# Altium footprint library mcu_modules.PcbLib: 16 footprints (part 1 of 2)
Each footprint in its own frame and in the unit in brackets; x right, y up, seen from the top. Pads: shape width x height; smd on the part's side, far side on the other; paste and mask are expansions set on the pad; w line width, h text height; cw(c..) or ccw(c..) is an arc to the next point about the centre after c.
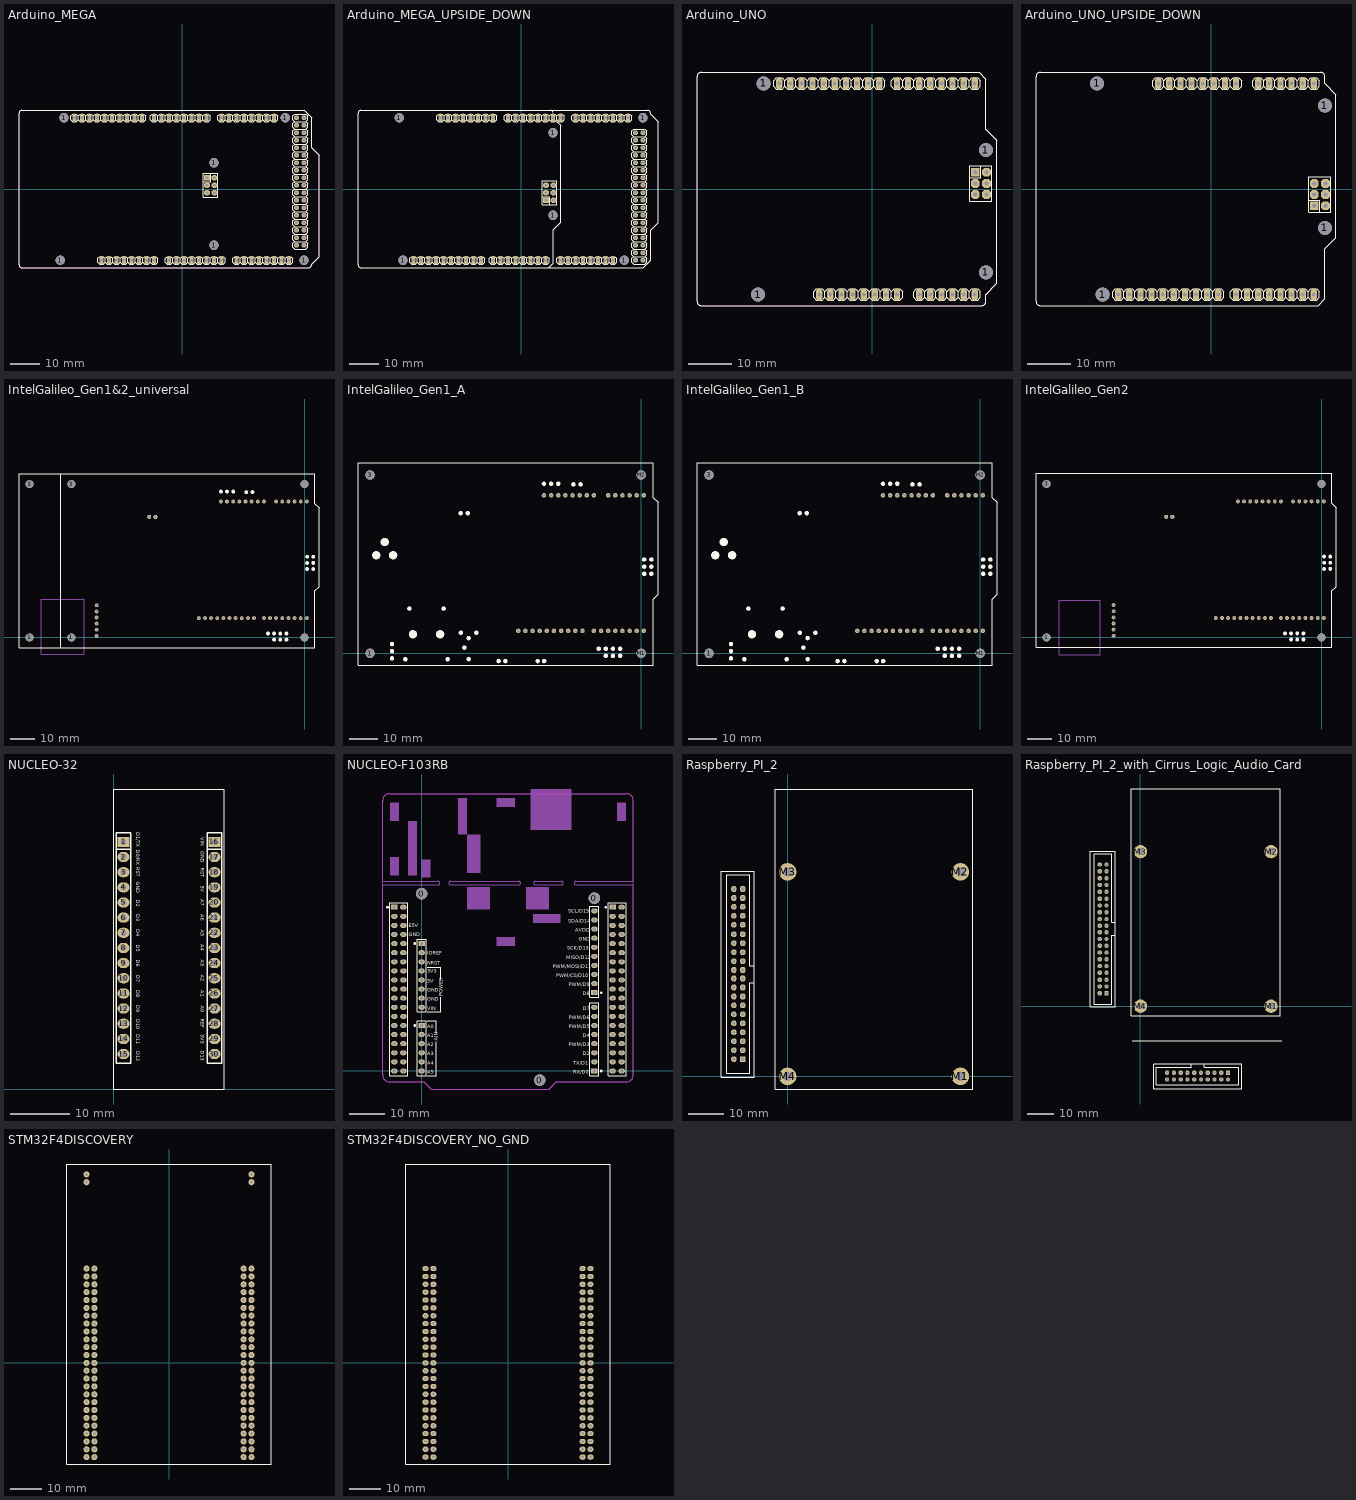
[diagram p0: the footprints below, top view; thin cyan lines are the x and y axes]

## Arduino_MEGA [mil]
pads (98):
  round 125.98 hole 125.98: 1(-1625,-950) 1(-1575,950) 1(425,-750) 1(425,350) 1(1375,950) 1(1625,-950)
  oct 66x66 hole 37.4: 5V(1525,950) 5V(1625,950) D22(1525,850) D23(1625,850) D24(1525,750) D25(1625,750) D26(1525,650) D27(1625,650) D28(1525,550) D29(1625,550) D30(1525,450) D31(1625,450) D32(1525,350) D33(1625,350) D34(1525,250) D35(1625,250) D36(1525,150) D37(1625,150) D38(1525,50) D39(1625,50) D40(1525,-50) D41(1625,-50) D42(1525,-150) D43(1625,-150) D44(1525,-250) D45(1625,-250) D46(1525,-350) D47(1625,-350) D48(1525,-450) D49(1625,-450) D50(1525,-550) D51(1625,-550) D52(1525,-650) D53(1625,-650) GND(1525,-750) GND(1625,-750)
  oval 56x112 hole 33.46: A0(-175,-950) A1(-75,-950) A2(25,-950) A3(125,-950) A4(225,-950) A5(325,-950) A6(425,-950) A7(525,-950) A8(725,-950) A9(825,-950) A10(925,-950) A11(1025,-950) A12(1125,-950) A13(1225,-950) A14(1325,-950) A15(1425,-950) AREF(-1235,950) D0(325,950) D1(225,950) D2(125,950) D3(25,950) D4(-75,950) D5(-175,950) D6(-275,950) D7(-375,950) D8(-535,950) D9(-635,950) D10(-735,950) D11(-835,950) D12(-935,950) D13(-1035,950) D14(525,950) D15(625,950) D16(725,950) D17(825,950) D18(925,950) D19(1025,950) D20(1125,950) D21(1225,950) GND(-1135,950) P1(-1075,-950) P2(-975,-950) P3(-875,-950) P4(-775,-950) P5(-675,-950) P6(-575,-950) P7(-475,-950) P8(-375,-950) SCL(-1435,950) SDA(-1335,950)
  rect 78.74x78.74 hole 39.37: PROG1(330,150)
  oct 78.74x78.74 hole 39.37: PROG2(430,150) PROG3(330,50) PROG4(430,50) PROG5(330,-50) PROG6(430,-50)
Top Overlay:
  drawing of 501 lines, arcs and shapes, not listed
Keep-Out Layer:
  lines w10: -2175,-1010.63 ccw(c-2135.63,-1010.63) -2135.63,-1050 1685.63,-1050 ccw(c1685.63,-1010.63) 1725,-1010.63 1725,-1000 1825,-900 1825,450 1725,550 1725,950 1625,1050 -2135.63,1050 ccw(c-2135.63,1010.63) -2175,1010.63 -2175,-1010.63
Mechanical 16:
  region: -365,960 -385,960 -385,940 -365,940
  region: 335,960 315,960 315,940 335,940
  region: 235,960 215,960 215,940 235,940
  region: 135,960 115,960 115,940 135,940
  region: 35,960 15,960 15,940 35,940
  region: -65,960 -85,960 -85,940 -65,940
  region: -165,960 -185,960 -185,940 -165,940
  region: -265,960 -285,960 -285,940 -265,940
  rectangle: 515,-960 535,-940
  rectangle: -185,-960 -165,-940
  rectangle: -85,-960 -65,-940
  rectangle: 15,-960 35,-940
  rectangle: 115,-960 135,-940
  rectangle: 215,-960 235,-940
  rectangle: 315,-960 335,-940
  rectangle: 415,-960 435,-940
  region: 535,960 515,960 515,940 535,940
  region: 1235,960 1215,960 1215,940 1235,940
  region: 1135,960 1115,960 1115,940 1135,940
  region: 1035,960 1015,960 1015,940 1035,940
  region: 935,960 915,960 915,940 935,940
  region: 835,960 815,960 815,940 835,940
  region: 735,960 715,960 715,940 735,940
  region: 635,960 615,960 615,940 635,940
  rectangle: 1415,-960 1435,-940
  rectangle: 715,-960 735,-940
  rectangle: 815,-960 835,-940
  rectangle: 915,-960 935,-940
  rectangle: 1015,-960 1035,-940
  rectangle: 1115,-960 1135,-940
  rectangle: 1215,-960 1235,-940
  rectangle: 1315,-960 1335,-940
  region: 1515,-740 1515,-760 1535,-760 1535,-740
  region: 1615,-740 1615,-760 1635,-760 1635,-740
  region: 1515,-640 1515,-660 1535,-660 1535,-640
  region: 1615,-640 1615,-660 1635,-660 1635,-640
  region: 1515,-540 1515,-560 1535,-560 1535,-540
  region: 1615,-540 1615,-560 1635,-560 1635,-540
  region: 1515,-440 1515,-460 1535,-460 1535,-440
  region: 1615,-440 1615,-460 1635,-460 1635,-440
  region: 1515,-340 1515,-360 1535,-360 1535,-340
  region: 1615,-340 1615,-360 1635,-360 1635,-340
  region: 1515,-240 1515,-260 1535,-260 1535,-240
  region: 1615,-240 1615,-260 1635,-260 1635,-240
  region: 1515,-140 1515,-160 1535,-160 1535,-140
  region: 1615,-140 1615,-160 1635,-160 1635,-140
  region: 1515,-40 1515,-60 1535,-60 1535,-40
  region: 1615,-40 1615,-60 1635,-60 1635,-40
  region: 1515,60 1515,40 1535,40 1535,60
  region: 1615,60 1615,40 1635,40 1635,60
  region: 1515,160 1515,140 1535,140 1535,160
  region: 1615,160 1615,140 1635,140 1635,160
  region: 1515,260 1515,240 1535,240 1535,260
  region: 1615,260 1615,240 1635,240 1635,260
  region: 1515,360 1515,340 1535,340 1535,360
  region: 1615,360 1615,340 1635,340 1635,360
  region: 1515,460 1515,440 1535,440 1535,460
  region: 1515,560 1515,540 1535,540 1535,560
  region: 1515,660 1515,640 1535,640 1535,660
  region: 1615,460 1615,440 1635,440 1635,460
  region: 1615,560 1615,540 1635,540 1635,560
  region: 1615,660 1615,640 1635,640 1635,660
  region: 1515,760 1515,740 1535,740 1535,760
  region: 1615,760 1615,740 1635,740 1635,760
  region: 1515,860 1515,840 1535,840 1535,860
  region: 1615,860 1615,840 1635,840 1635,860
  region: 1615,960 1615,940 1635,940 1635,960
  region: 1515,960 1515,940 1535,940 1535,960
  rectangle: -545,940 -525,960
  rectangle: -1445,940 -1425,960
  rectangle: -1345,940 -1325,960
  rectangle: -1245,940 -1225,960
  rectangle: -1145,940 -1125,960
  rectangle: -1045,940 -1025,960
  rectangle: -945,940 -925,960
  rectangle: -845,940 -825,960
  rectangle: -745,940 -725,960
  rectangle: -645,940 -625,960
  rectangle: -385,-960 -365,-940
  rectangle: -1085,-960 -1065,-940
  rectangle: -985,-960 -965,-940
  rectangle: -885,-960 -865,-940
  rectangle: -785,-960 -765,-940
  rectangle: -685,-960 -665,-940
  rectangle: -585,-960 -565,-940
  rectangle: -485,-960 -465,-940
3D body "Samtec-SSW-103-01-G-D.step": height 335, standoff -104, extent 282.49,-110 477.49,210
3D body "User Library-ARDUINO_MEGA_2560.STEP": height 694.88, standoff 94.49, extent -2424.99,-1049.99 1825.01,1050.01

## Arduino_MEGA_UPSIDE_DOWN [mil]
pads (98):
  round 125.98 hole 125.98: 1(-1625,950) 1(-1575,-950) 1(425,-350) 1(425,750) 1(1375,-950) 1(1625,950)
  oct 66x66 hole 37.4: 5V(1525,-950) 5V(1625,-950) D22(1525,-850) D23(1625,-850) D24(1525,-750) D25(1625,-750) D26(1525,-650) D27(1625,-650) D28(1525,-550) D29(1625,-550) D30(1525,-450) D31(1625,-450) D32(1525,-350) D33(1625,-350) D34(1525,-250) D35(1625,-250) D36(1525,-150) D37(1625,-150) D38(1525,-50) D39(1625,-50) D40(1525,50) D41(1625,50) D42(1525,150) D43(1625,150) D44(1525,250) D45(1625,250) D46(1525,350) D47(1625,350) D48(1525,450) D49(1625,450) D50(1525,550) D51(1625,550) D52(1525,650) D53(1625,650) GND(1525,750) GND(1625,750)
  oval 56x112 hole 33.46: A0(-175,950) A1(-75,950) A2(25,950) A3(125,950) A4(225,950) A5(325,950) A6(425,950) A7(525,950) A8(725,950) A9(825,950) A10(925,950) A11(1025,950) A12(1125,950) A13(1225,950) A14(1325,950) A15(1425,950) AREF(-1235,-950) D0(325,-950) D1(225,-950) D2(125,-950) D3(25,-950) D4(-75,-950) D5(-175,-950) D6(-275,-950) D7(-375,-950) D8(-535,-950) D9(-635,-950) D10(-735,-950) D11(-835,-950) D12(-935,-950) D13(-1035,-950) D14(525,-950) D15(625,-950) D16(725,-950) D17(825,-950) D18(925,-950) D19(1025,-950) D20(1125,-950) D21(1225,-950) GND(-1135,-950) P1(-1075,950) P2(-975,950) P3(-875,950) P4(-775,950) P5(-675,950) P6(-575,950) P7(-475,950) P8(-375,950) SCL(-1435,-950) SDA(-1335,-950)
  rect 78.74x78.74 hole 39.37: PROG1(330,-150)
  oct 78.74x78.74 hole 39.37: PROG2(430,-150) PROG3(330,-50) PROG4(430,-50) PROG5(330,50) PROG6(430,50)
Top Overlay:
  drawing of 507 lines, arcs and shapes, not listed
Mechanical 16:
  region: -365,-940 -385,-940 -385,-960 -365,-960
  region: 335,-940 315,-940 315,-960 335,-960
  region: 235,-940 215,-940 215,-960 235,-960
  region: 135,-940 115,-940 115,-960 135,-960
  region: 35,-940 15,-940 15,-960 35,-960
  region: -65,-940 -85,-940 -85,-960 -65,-960
  region: -165,-940 -185,-940 -185,-960 -165,-960
  region: -265,-940 -285,-940 -285,-960 -265,-960
  rectangle: 515,940 535,960
  rectangle: -185,940 -165,960
  rectangle: -85,940 -65,960
  rectangle: 15,940 35,960
  rectangle: 115,940 135,960
  rectangle: 215,940 235,960
  rectangle: 315,940 335,960
  rectangle: 415,940 435,960
  region: 535,-940 515,-940 515,-960 535,-960
  region: 1235,-940 1215,-940 1215,-960 1235,-960
  region: 1135,-940 1115,-940 1115,-960 1135,-960
  region: 1035,-940 1015,-940 1015,-960 1035,-960
  region: 935,-940 915,-940 915,-960 935,-960
  region: 835,-940 815,-940 815,-960 835,-960
  region: 735,-940 715,-940 715,-960 735,-960
  region: 635,-940 615,-940 615,-960 635,-960
  rectangle: 1415,940 1435,960
  rectangle: 715,940 735,960
  rectangle: 815,940 835,960
  rectangle: 915,940 935,960
  rectangle: 1015,940 1035,960
  rectangle: 1115,940 1135,960
  rectangle: 1215,940 1235,960
  rectangle: 1315,940 1335,960
  region: 1535,740 1535,760 1515,760 1515,740
  region: 1635,740 1635,760 1615,760 1615,740
  region: 1535,640 1535,660 1515,660 1515,640
  region: 1635,640 1635,660 1615,660 1615,640
  region: 1535,540 1535,560 1515,560 1515,540
  region: 1635,540 1635,560 1615,560 1615,540
  region: 1535,440 1535,460 1515,460 1515,440
  region: 1635,440 1635,460 1615,460 1615,440
  region: 1535,340 1535,360 1515,360 1515,340
  region: 1635,340 1635,360 1615,360 1615,340
  region: 1535,240 1535,260 1515,260 1515,240
  region: 1635,240 1635,260 1615,260 1615,240
  region: 1535,140 1535,160 1515,160 1515,140
  region: 1635,140 1635,160 1615,160 1615,140
  region: 1535,40 1535,60 1515,60 1515,40
  region: 1635,40 1635,60 1615,60 1615,40
  region: 1535,-60 1535,-40 1515,-40 1515,-60
  region: 1635,-60 1635,-40 1615,-40 1615,-60
  region: 1535,-160 1535,-140 1515,-140 1515,-160
  region: 1635,-160 1635,-140 1615,-140 1615,-160
  region: 1535,-260 1535,-240 1515,-240 1515,-260
  region: 1635,-260 1635,-240 1615,-240 1615,-260
  region: 1535,-360 1535,-340 1515,-340 1515,-360
  region: 1635,-360 1635,-340 1615,-340 1615,-360
  region: 1535,-460 1535,-440 1515,-440 1515,-460
  region: 1535,-560 1535,-540 1515,-540 1515,-560
  region: 1535,-660 1535,-640 1515,-640 1515,-660
  region: 1635,-460 1635,-440 1615,-440 1615,-460
  region: 1635,-560 1635,-540 1615,-540 1615,-560
  region: 1635,-660 1635,-640 1615,-640 1615,-660
  region: 1535,-760 1535,-740 1515,-740 1515,-760
  region: 1635,-760 1635,-740 1615,-740 1615,-760
  region: 1535,-860 1535,-840 1515,-840 1515,-860
  region: 1635,-860 1635,-840 1615,-840 1615,-860
  region: 1635,-960 1635,-940 1615,-940 1615,-960
  region: 1535,-960 1535,-940 1515,-940 1515,-960
  rectangle: -545,-960 -525,-940
  rectangle: -1445,-960 -1425,-940
  rectangle: -1345,-960 -1325,-940
  rectangle: -1245,-960 -1225,-940
  rectangle: -1145,-960 -1125,-940
  rectangle: -1045,-960 -1025,-940
  rectangle: -945,-960 -925,-940
  rectangle: -845,-960 -825,-940
  rectangle: -745,-960 -725,-940
  rectangle: -645,-960 -625,-940
  rectangle: -385,940 -365,960
  rectangle: -1085,940 -1065,960
  rectangle: -985,940 -965,960
  rectangle: -885,940 -865,960
  rectangle: -785,940 -765,960
  rectangle: -685,940 -665,960
  rectangle: -585,940 -565,960
  rectangle: -485,940 -465,960
3D body "User Library-ARDUINO_MEGA_2560.STEP": height 692.91, standoff 92.52, extent -2424.99,-1050 1825.01,1050
3D body "Samtec-SSW-103-01-G-D.step": height 335, standoff -104, extent 282.5,-209.99 477.5,110.01

## Arduino_UNO [mil]
pads (42):
  round 125.98 hole 125.98: 1(-1025,-950) 1(-975,950) 1(1025,-750) 1(1025,350)
  oval 56x112 hole 33.46: A0(425,-950) A1(525,-950) A2(625,-950) A3(725,-950) A4(825,-950) A5(925,-950) AREF(-635,950) D0(925,950) D1(825,950) D2(725,950) D3(625,950) D4(525,950) D5(425,950) D6(325,950) D7(225,950) D8(65,950) D9(-35,950) D10(-135,950) D11(-235,950) D12(-335,950) D13(-435,950) GND(-535,950) P1(-475,-950) P2(-375,-950) P3(-275,-950) P4(-175,-950) P5(-75,-950) P6(25,-950) P7(125,-950) P8(225,-950) SCL(-835,950) SDA(-735,950)
  rect 78.74x78.74 hole 39.37: PROG1(930,150)
  oct 78.74x78.74 hole 39.37: PROG2(1030,150) PROG3(930,50) PROG4(1030,50) PROG5(930,-50) PROG6(1030,-50)
Top Overlay:
  drawing of 246 lines, arcs and shapes, not listed
Keep-Out Layer:
  lines w10: -1575,-1010.63 ccw(c-1535.63,-1010.63) -1535.63,-1050 985.63,-1050 ccw(c985.63,-1010.63) 1025,-1010.63 1025,-950 1125,-850 1125,440 1025,540 1025,990 965,1050 -1535.63,1050 ccw(c-1535.63,1010.63) -1575,1010.63 -1575,-1010.63
Mechanical 16:
  rectangle: 115,-960 135,-940
  rectangle: 15,-960 35,-940
  rectangle: -85,-960 -65,-940
  rectangle: -185,-960 -165,-940
  rectangle: -285,-960 -265,-940
  rectangle: -385,-960 -365,-940
  rectangle: -485,-960 -465,-940
  rectangle: 215,-960 235,-940
  rectangle: 815,-960 835,-940
  rectangle: 715,-960 735,-940
  rectangle: 615,-960 635,-940
  rectangle: 515,-960 535,-940
  rectangle: 415,-960 435,-940
  rectangle: 915,-960 935,-940
  region: -725,960 -745,960 -745,940 -725,940
  region: -625,960 -645,960 -645,940 -625,940
  region: -525,960 -545,960 -545,940 -525,940
  region: -425,960 -445,960 -445,940 -425,940
  region: -325,960 -345,960 -345,940 -325,940
  region: -225,960 -245,960 -245,940 -225,940
  region: -125,960 -145,960 -145,940 -125,940
  region: -25,960 -45,960 -45,940 -25,940
  region: 75,960 55,960 55,940 75,940
  region: -825,960 -845,960 -845,940 -825,940
  region: 335,960 315,960 315,940 335,940
  region: 435,960 415,960 415,940 435,940
  region: 535,960 515,960 515,940 535,940
  region: 635,960 615,960 615,940 635,940
  region: 735,960 715,960 715,940 735,940
  region: 835,960 815,960 815,940 835,940
  region: 935,960 915,960 915,940 935,940
  region: 235,960 215,960 215,940 235,940
Mechanical 69:
  text "D:/SmartProjects/Snc/a4_bn_logo2.bmp" at -1575,-1052.5 h0.85
3D body "Samtec-SSW-103-01-G-D.step": height 335, standoff -104, extent 882.49,-110 1077.49,210
3D body "User Library-ARDUINO_UNO_R3_1.STEP": height 696.85, standoff 96.46, extent -1824.99,-1049.99 1125.01,1050.01

## Arduino_UNO_UPSIDE_DOWN [mil]
pads (42):
  round 125.98 hole 125.98: 1(-1025,950) 1(-975,-950) 1(1025,-350) 1(1025,750)
  oval 56x112 hole 33.46: A0(425,950) A1(525,950) A2(625,950) A3(725,950) A4(825,950) A5(925,950) AREF(-635,-950) D0(925,-950) D1(825,-950) D2(725,-950) D3(625,-950) D4(525,-950) D5(425,-950) D6(325,-950) D7(225,-950) D8(65,-950) D9(-35,-950) D10(-135,-950) D11(-235,-950) D12(-335,-950) D13(-435,-950) GND(-535,-950) P1(-475,950) P2(-375,950) P3(-275,950) P4(-175,950) P5(-75,950) P6(25,950) P7(125,950) P8(225,950) SCL(-835,-950) SDA(-735,-950)
  rect 78.74x78.74 hole 39.37: PROG1(930,-150)
  oct 78.74x78.74 hole 39.37: PROG2(1030,-150) PROG3(930,-50) PROG4(1030,-50) PROG5(930,50) PROG6(1030,50)
Top Overlay:
  drawing of 246 lines, arcs and shapes, not listed
Mechanical 16:
  region: 235,-940 215,-940 215,-960 235,-960
  region: 935,-940 915,-940 915,-960 935,-960
  region: 835,-940 815,-940 815,-960 835,-960
  region: 735,-940 715,-940 715,-960 735,-960
  region: 635,-940 615,-940 615,-960 635,-960
  region: 535,-940 515,-940 515,-960 535,-960
  region: 435,-940 415,-940 415,-960 435,-960
  region: 335,-940 315,-940 315,-960 335,-960
  region: -825,-940 -845,-940 -845,-960 -825,-960
  region: 75,-940 55,-940 55,-960 75,-960
  region: -25,-940 -45,-940 -45,-960 -25,-960
  region: -125,-940 -145,-940 -145,-960 -125,-960
  region: -225,-940 -245,-940 -245,-960 -225,-960
  region: -325,-940 -345,-940 -345,-960 -325,-960
  region: -425,-940 -445,-940 -445,-960 -425,-960
  region: -525,-940 -545,-940 -545,-960 -525,-960
  region: -625,-940 -645,-940 -645,-960 -625,-960
  region: -725,-940 -745,-940 -745,-960 -725,-960
  rectangle: 915,940 935,960
  rectangle: 415,940 435,960
  rectangle: 515,940 535,960
  rectangle: 615,940 635,960
  rectangle: 715,940 735,960
  rectangle: 815,940 835,960
  rectangle: 215,940 235,960
  rectangle: -485,940 -465,960
  rectangle: -385,940 -365,960
  rectangle: -285,940 -265,960
  rectangle: -185,940 -165,960
  rectangle: -85,940 -65,960
  rectangle: 15,940 35,960
  rectangle: 115,940 135,960
Mechanical 69:
  text "D:/SmartProjects/Snc/a4_bn_logo2.bmp" at -1575,1052.5 h0.85
3D body "Samtec-SSW-103-01-G-D.step": height 335, standoff -104, extent 882.5,-209.99 1077.5,110.01
3D body "User Library-ARDUINO_UNO_R3_1.STEP": height 690.95, standoff 90.55, extent -1825,-1050 1125,1050

## IntelGalileo_Gen1&2_universal [mm]
pads (68):
  round 3.3 hole 3.3: 1(-113.792,0) 1(-96.5,0) 3(-113.792,63.5) 3(-96.5,63.5) M1(0,0) M2(0,63.5)
  round 1.6 on Top Overlay: 37(-64.262,49.886) 37(-61.722,49.886) 37(-34.595,60.376) 37(-32.055,60.376) 37(-29.515,60.376) 37(-24.105,60.147) 37(-21.565,60.147) 37(-15.113,1.626) 37(-12.573,-0.914) 37(-12.573,1.626) 37(-10.033,-0.914) 37(-10.033,1.626) 37(-10.033,1.626) 37(-10.033,1.626) 37(-7.493,-0.914) 37(-7.493,1.626) 37(1.092,28.321) 37(1.092,30.861) 37(1.092,33.401) 37(3.632,28.321) 37(3.632,30.861) 37(3.632,33.401)
  round 1.6 hole 1: A0(-11.735,56.261) A1(-9.195,56.261) A2(-6.655,56.261) A3(-4.115,56.261) A4(-1.575,56.261) A5(0.965,56.261) COIN+(-61.722,49.886) COIN-(-64.262,49.886) D0(0.965,8.001) D1(-1.575,8.001) D2(-4.115,8.001) D3(-6.655,8.001) D4(-9.195,8.001) D5(-11.735,8.001) D6(-14.275,8.001) D7(-16.815,8.001) D8(-20.879,8.001) D9(-23.419,8.001) D10(-25.959,8.001) D11(-28.499,8.001) D12(-31.039,8.001) D13(-33.579,8.001) D14(-36.119,8.001) D15(-38.659,8.001) D16(-41.199,8.001) D17(-43.739,8.001) P1(-34.595,56.261) P2(-32.055,56.261) P3(-29.515,56.261) P4(-26.975,56.261) P5(-24.435,56.261) P6(-21.895,56.261) P7(-19.355,56.261) P8(-16.815,56.261) U1(-86.03,13.335) U2(-86.03,10.795) U3(-86.03,8.255) U4(-86.03,5.715) U5(-86.03,3.175) U6(-86.03,0.635)
Top Overlay:
  lines w0.2: -100.8,-4.2 -100.8,67.8 ; -118.161,-4.2 -118.161,67.8 4.3,67.8 4.3,55.4 6,53.7 6,21 4.3,19.3 4.3,-4.2 -118.161,-4.2
Mechanical 3:
  lines w0.2: -108.89,-6.985 -91.11,-6.985 -91.11,15.875 -108.89,15.875 -108.89,-6.985
3D body "Samtec-SSW-106-01-G-S.step": height 8.51, standoff -2.64, extent -87.236,-0.889 -84.823,14.859
3D body "User Library-RMS-001L-08A0-GY.STEP": height 14.85, standoff -1.95, extent -107.9,-6.6 -91.9,14.7
3D body: height 18, standoff 12.6, extent -84.4,59.3 -71.5,64.5
3D body "Samtec-TSW-106-23-F-S.STEP": height 14.02, standoff 2.72, extent -87.37,-0.54 -84.83,14.7
3D body "User Library-MicroUSB-B_Molex_105017-0001.step": height 11.83, standoff 8.52, extent -79.6,-5.5 -71.4,-0.07
3D body "screwcl_m3x16.stp": height 14.56, standoff -3.44, extent -2.75,-2.75 2.75,2.75
3D body "screwcl_m3x16.stp": height 14.56, standoff -3.44, extent -2.75,60.75 2.75,66.25
3D body "screwcl_m3x16.stp": height 14.56, standoff -3.44, extent -116.542,-2.75 -111.042,2.75
3D body "screwcl_m3x16.stp": height 14.56, standoff -3.44, extent -116.542,60.75 -111.042,66.25
3D body "User Library-PCI Express Mini Card (Full-Mini Card).step": height 20.7, standoff 15.95, extent -68,9.525 -38,60.475
3D body "483380065.STEP": height 19, standoff 11.85, extent -67.85,56.2 -37.85,65.5
3D body "Samtec-TSW-110-23-F-S.STEP": height 8.38, standoff -2.92, extent -45.009,6.731 -19.609,9.271
3D body "Samtec-TSW-108-23-F-S.STEP": height 8.38, standoff -2.92, extent -18.085,6.731 2.235,9.271
3D body "Samtec-TSW-106-23-F-S.STEP": height 8.38, standoff -2.92, extent -13.005,54.991 2.235,57.531
3D body "Samtec-TSW-108-23-F-S.STEP": height 8.38, standoff -2.92, extent -35.865,54.991 -15.545,57.531
3D body "Samtec-TSW-103-23-F-S.STEP": height 14.02, standoff 2.72, extent -90.08,16.63 -82.46,19.17
3D body "Samtec-TSW-103-23-F-S.STEP": height 14.02, standoff 2.72, extent -35.865,59.106 -28.245,61.646
3D body "Samtec-TSW-102-23-F-S.STEP": height 14.02, standoff 2.72, extent -65.532,48.616 -60.452,51.156
3D body "Samtec-TSW-102-23-F-S.STEP": height 14.02, standoff 2.72, extent -25.375,58.877 -20.295,61.417
3D body "Samtec-TSW-103-23-F-D.STEP": height 14.02, standoff 2.72, extent -0.178,27.051 4.902,34.671
3D body "Samtec-TSW-104-23-F-D.STEP": height 14.02, standoff 2.72, extent -16.383,-2.184 -6.223,2.896
3D body "Samtec-SSW-106-01-G-S.step": height 13.74, standoff 2.59, extent -13.259,55.055 2.489,57.468
3D body "Samtec-SSW-108-01-G-S.step": height 13.74, standoff 2.59, extent -36.119,55.055 -15.291,57.468
3D body "Samtec-SSW-108-01-G-S.step": height 13.74, standoff 2.59, extent -18.339,6.795 2.489,9.208
3D body "Samtec-SSW-110-01-G-S.step": height 13.74, standoff 2.59, extent -45.263,6.795 -19.355,9.208
3D body: height 12.7, standoff 11.1, extent -118.161,-4.2 6,67.8
3D body "User Library-dc range - dc connector[4840_2201].step": height 14.7, standoff 0.2, extent -119.913,20.4 -106.087,29.905
3D body "User Library-USB Socket.step": height 12.73, standoff 4.7, extent -63,-6.14 -48.4,8.09
3D body "Samtec-SSW-101-01-G-D.step": height 8.51, standoff -2.64, extent -65.469,48.362 -60.515,51.41

## IntelGalileo_Gen1_A [mm]
pads (79):
  round 3.3 hole 3.3: 1(-96.5,0) 3(-96.5,63.5) M1(0,0) M2(0,63.5)
  round 3 on Top Overlay: 37(-94.29,34.925) 37(-91.29,39.625) 37(-88.29,34.925) 37(-81.229,6.807) 37(-71.577,6.807)
  round 1.6 on Top Overlay: 37(-88.697,-1.778) 37(-88.697,0.762) 37(-88.697,3.302) 37(-83.922,-2.083) 37(-82.499,15.951) 37(-70.307,15.951) 37(-68.885,-2.083) 37(-64.262,49.886) 37(-64.166,7.332) 37(-62.916,2.032) 37(-61.722,49.886) 37(-61.416,-2.068) 37(-61.416,5.432) 37(-58.666,7.332) 37(-50.731,-2.743) 37(-48.329,-2.743) 37(-36.812,-2.743) 37(-34.595,60.376) 37(-34.512,-2.743) 37(-32.055,60.376) 37(-29.515,60.376) 37(-24.105,60.147) 37(-21.565,60.147) 37(-15.113,1.626) 37(-12.573,-0.914) 37(-12.573,1.626) 37(-10.033,-0.914) 37(-10.033,1.626) 37(-10.033,1.626) 37(-10.033,1.626) 37(-7.493,-0.914) 37(-7.493,1.626) 37(1.092,28.321) 37(1.092,30.861) 37(1.092,33.401) 37(3.632,28.321) 37(3.632,30.861) 37(3.632,33.401)
  round 1.6 hole 1: A0(-11.735,56.261) A1(-9.195,56.261) A2(-6.655,56.261) A3(-4.115,56.261) A4(-1.575,56.261) A5(0.965,56.261) D0(0.965,8.001) D1(-1.575,8.001) D2(-4.115,8.001) D3(-6.655,8.001) D4(-9.195,8.001) D5(-11.735,8.001) D6(-14.275,8.001) D7(-16.815,8.001) D8(-20.879,8.001) D9(-23.419,8.001) D10(-25.959,8.001) D11(-28.499,8.001) D12(-31.039,8.001) D13(-33.579,8.001) D14(-36.119,8.001) D15(-38.659,8.001) D16(-41.199,8.001) D17(-43.739,8.001) P1(-34.595,56.261) P2(-32.055,56.261) P3(-29.515,56.261) P4(-26.975,56.261) P5(-24.435,56.261) P6(-21.895,56.261) P7(-19.355,56.261) P8(-16.815,56.261)
Top Overlay:
  lines w0.2: -100.8,-4.2 4.3,-4.2 4.3,19.3 6,21 6,53.7 4.3,55.4 4.3,67.8 -100.8,67.8 -100.8,-4.2
3D body "screwcl_m3x16.stp": height 14.56, standoff -3.44, extent -2.75,-2.75 2.75,2.75
3D body "screwcl_m3x16.stp": height 14.56, standoff -3.44, extent -2.75,60.75 2.75,66.25
3D body "screwcl_m3x16.stp": height 14.56, standoff -3.44, extent -99.25,60.75 -93.75,66.25
3D body: height 12.7, standoff 11.1, extent -100.8,-4.2 6,67.8
3D body "Samtec-SSW-110-01-G-S.step": height 13.74, standoff 2.59, extent -45.263,6.795 -19.355,9.208
3D body "Samtec-SSW-108-01-G-S.step": height 13.74, standoff 2.59, extent -18.339,6.795 2.489,9.208
3D body "Samtec-SSW-108-01-G-S.step": height 13.74, standoff 2.59, extent -36.119,55.055 -15.291,57.468
3D body "Samtec-SSW-106-01-G-S.step": height 13.74, standoff 2.59, extent -13.259,55.055 2.489,57.468
3D body "Samtec-TSW-104-23-F-D.STEP": height 14.02, standoff 2.72, extent -16.383,-2.184 -6.223,2.896
3D body "Samtec-TSW-103-23-F-D.STEP": height 14.02, standoff 2.72, extent -0.178,27.051 4.902,34.671
3D body "Samtec-TSW-102-23-F-S.STEP": height 14.02, standoff 2.72, extent -25.375,58.877 -20.295,61.417
3D body "Samtec-TSW-102-23-F-S.STEP": height 14.02, standoff 2.72, extent -65.532,48.616 -60.452,51.156
3D body "Samtec-TSW-103-23-F-S.STEP": height 14.02, standoff 2.72, extent -35.865,59.106 -28.245,61.646
3D body: height 11.1, standoff 0, extent -85.5,-5.5 -67.5,18.5
3D body: height 11.1, standoff 0, extent -101.5,30 -86.5,40
3D body: height 11.1, standoff 5.1, extent -65,-5.5 -58,8.5
3D body "Samtec-TSW-103-23-F-S.STEP": height 14.02, standoff 2.72, extent -89.967,-3.048 -87.427,4.572
3D body "Samtec-TSW-108-23-F-S.STEP": height 8.38, standoff -2.92, extent -35.865,54.991 -15.545,57.531
3D body "Samtec-TSW-106-23-F-S.STEP": height 8.38, standoff -2.92, extent -13.005,54.991 2.235,57.531
3D body "Samtec-TSW-108-23-F-S.STEP": height 8.38, standoff -2.92, extent -18.085,6.731 2.235,9.271
3D body "Samtec-TSW-110-23-F-S.STEP": height 8.38, standoff -2.92, extent -45.009,6.731 -19.609,9.271
3D body "483380065.STEP": height 19, standoff 11.85, extent -67.85,56.2 -37.85,65.5
3D body "User Library-PCI Express Mini Card (Full-Mini Card).step": height 20.7, standoff 15.95, extent -68,9.525 -38,60.475
3D body "screwcl_m3x16.stp": height 14.56, standoff -3.44, extent -99.25,-2.75 -93.75,2.75

## IntelGalileo_Gen1_B [mm]
pads (79):
  round 3.3 hole 3.3: 1(-96.5,0) 3(-96.5,63.5) M1(0,0) M2(0,63.5)
  round 3 on Top Overlay: 37(-94.29,34.925) 37(-91.29,39.625) 37(-88.29,34.925) 37(-81.229,6.807) 37(-71.577,6.807)
  round 1.6 on Top Overlay: 37(-88.697,-1.778) 37(-88.697,0.762) 37(-88.697,3.302) 37(-83.922,-2.083) 37(-82.499,15.951) 37(-70.307,15.951) 37(-68.885,-2.083) 37(-64.262,49.886) 37(-64.166,7.332) 37(-62.916,2.032) 37(-61.722,49.886) 37(-61.416,-2.068) 37(-61.416,5.432) 37(-58.666,7.332) 37(-50.731,-2.743) 37(-48.329,-2.743) 37(-36.812,-2.743) 37(-34.595,60.376) 37(-34.512,-2.743) 37(-32.055,60.376) 37(-29.515,60.376) 37(-24.105,60.147) 37(-21.565,60.147) 37(-15.113,1.626) 37(-12.573,-0.914) 37(-12.573,1.626) 37(-10.033,-0.914) 37(-10.033,1.626) 37(-10.033,1.626) 37(-10.033,1.626) 37(-7.493,-0.914) 37(-7.493,1.626) 37(1.092,28.321) 37(1.092,30.861) 37(1.092,33.401) 37(3.632,28.321) 37(3.632,30.861) 37(3.632,33.401)
  round 1.6 hole 1: A0(-11.735,56.261) A1(-9.195,56.261) A2(-6.655,56.261) A3(-4.115,56.261) A4(-1.575,56.261) A5(0.965,56.261) D0(0.965,8.001) D1(-1.575,8.001) D2(-4.115,8.001) D3(-6.655,8.001) D4(-9.195,8.001) D5(-11.735,8.001) D6(-14.275,8.001) D7(-16.815,8.001) D8(-20.879,8.001) D9(-23.419,8.001) D10(-25.959,8.001) D11(-28.499,8.001) D12(-31.039,8.001) D13(-33.579,8.001) D14(-36.119,8.001) D15(-38.659,8.001) D16(-41.199,8.001) D17(-43.739,8.001) P1(-34.595,56.261) P2(-32.055,56.261) P3(-29.515,56.261) P4(-26.975,56.261) P5(-24.435,56.261) P6(-21.895,56.261) P7(-19.355,56.261) P8(-16.815,56.261)
Top Overlay:
  lines w0.2: -100.8,-4.2 -100.8,67.8 4.3,67.8 4.3,55.4 6,53.7 6,21 4.3,19.3 4.3,-4.2 -100.8,-4.2
3D body "User Library-PCI Express Mini Card (Full-Mini Card).step": height 23.3, standoff 18.55, extent -69.4,9.825 -39.4,60.775
3D body "483380065.STEP": height 19, standoff 11.85, extent -67.85,56.2 -37.85,65.5
3D body "Samtec-TSW-110-23-F-S.STEP": height 8.38, standoff -2.92, extent -45.009,6.731 -19.609,9.271
3D body "Samtec-TSW-108-23-F-S.STEP": height 8.38, standoff -2.92, extent -18.085,6.731 2.235,9.271
3D body "Samtec-TSW-106-23-F-S.STEP": height 8.38, standoff -2.92, extent -13.005,54.991 2.235,57.531
3D body "Samtec-TSW-108-23-F-S.STEP": height 8.38, standoff -2.92, extent -35.865,54.991 -15.545,57.531
3D body "Samtec-TSW-103-23-F-S.STEP": height 14.02, standoff 2.72, extent -89.967,-3.048 -87.427,4.572
3D body "Samtec-TSW-103-23-F-S.STEP": height 14.02, standoff 2.72, extent -35.865,59.106 -28.245,61.646
3D body "Samtec-TSW-102-23-F-S.STEP": height 14.02, standoff 2.72, extent -65.532,48.616 -60.452,51.156
3D body "Samtec-TSW-102-23-F-S.STEP": height 14.02, standoff 2.72, extent -25.375,58.877 -20.295,61.417
3D body "board.STEP": height 23.9, standoff -1.2, extent -102,-5.762 5.478,68

## IntelGalileo_Gen2 [mm]
pads (61):
  round 3.3 hole 3.3: 1(-113.792,0) 3(-113.792,63.5) M1(0,0) M2(0,63.5)
  round 1.6 on Top Overlay: 37(-64.262,49.886) 37(-61.722,49.886) 37(-15.113,1.626) 37(-12.573,-0.914) 37(-12.573,1.626) 37(-10.033,-0.914) 37(-10.033,1.626) 37(-10.033,1.626) 37(-10.033,1.626) 37(-7.493,-0.914) 37(-7.493,1.626) 37(1.092,28.321) 37(1.092,30.861) 37(1.092,33.401) 37(3.632,28.321) 37(3.632,30.861) 37(3.632,33.401)
  round 1.6 hole 1: A0(-11.735,56.261) A1(-9.195,56.261) A2(-6.655,56.261) A3(-4.115,56.261) A4(-1.575,56.261) A5(0.965,56.261) COIN+(-61.722,49.886) COIN-(-64.262,49.886) D0(0.965,8.001) D1(-1.575,8.001) D2(-4.115,8.001) D3(-6.655,8.001) D4(-9.195,8.001) D5(-11.735,8.001) D6(-14.275,8.001) D7(-16.815,8.001) D8(-20.879,8.001) D9(-23.419,8.001) D10(-25.959,8.001) D11(-28.499,8.001) D12(-31.039,8.001) D13(-33.579,8.001) D14(-36.119,8.001) D15(-38.659,8.001) D16(-41.199,8.001) D17(-43.739,8.001) P1(-34.595,56.261) P2(-32.055,56.261) P3(-29.515,56.261) P4(-26.975,56.261) P5(-24.435,56.261) P6(-21.895,56.261) P7(-19.355,56.261) P8(-16.815,56.261) U1(-86.03,13.335) U2(-86.03,10.795) U3(-86.03,8.255) U4(-86.03,5.715) U5(-86.03,3.175) U6(-86.03,0.635)
Top Overlay:
  lines w0.2: -118.161,-4.2 4.3,-4.2 4.3,19.3 6,21 6,53.7 4.3,55.4 4.3,67.8 -118.161,67.8 -118.161,-4.2
Mechanical 3:
  lines w0.2: -108.585,-7.112 -108.585,15.24 -91.567,15.24 -91.567,-7.112 -108.585,-7.112
3D body "Samtec-TSW-106-23-F-S.STEP": height 14.02, standoff 2.72, extent -87.3,-0.635 -84.76,14.605
3D body "Samtec-SSW-106-01-G-S.step": height 8.51, standoff -2.64, extent -87.236,-0.889 -84.823,14.859
3D body: height -12.6, standoff -13, extent -118.161,-4.2 6,67.8
3D body "Samtec-SSW-101-01-G-D.step": height 8.51, standoff -2.64, extent -65.469,48.362 -60.515,51.41
3D body "User Library-USB Socket.step": height 12.73, standoff 4.7, extent -63,-6.14 -48.4,8.09
3D body "User Library-dc range - dc connector[4840_2201].step": height 14.7, standoff 0.2, extent -119.913,20.4 -106.087,29.905
3D body: height 12.7, standoff 11.1, extent -118.161,-4.2 6,67.8
3D body "Samtec-SSW-110-01-G-S.step": height 13.74, standoff 2.59, extent -45.263,6.795 -19.355,9.208
3D body "Samtec-SSW-108-01-G-S.step": height 13.74, standoff 2.59, extent -18.339,6.795 2.489,9.208
3D body "Samtec-SSW-108-01-G-S.step": height 13.74, standoff 2.59, extent -36.119,55.055 -15.291,57.468
3D body "Samtec-SSW-106-01-G-S.step": height 13.74, standoff 2.59, extent -13.259,55.055 2.489,57.468
3D body "Samtec-TSW-104-23-F-D.STEP": height 14.02, standoff 2.72, extent -16.383,-2.184 -6.223,2.896
3D body "Samtec-TSW-103-23-F-D.STEP": height 14.02, standoff 2.72, extent -0.178,27.051 4.902,34.671
3D body "Samtec-TSW-102-23-F-S.STEP": height 14.02, standoff 2.72, extent -65.532,48.616 -60.452,51.156
3D body "Samtec-TSW-103-23-F-S.STEP": height 14.02, standoff 2.72, extent -90.08,16.63 -82.46,19.17
3D body "Samtec-TSW-108-23-F-S.STEP": height 8.38, standoff -2.92, extent -35.865,54.991 -15.545,57.531
3D body "Samtec-TSW-106-23-F-S.STEP": height 8.38, standoff -2.92, extent -13.005,54.991 2.235,57.531
3D body "Samtec-TSW-108-23-F-S.STEP": height 8.38, standoff -2.92, extent -18.085,6.731 2.235,9.271
3D body "Samtec-TSW-110-23-F-S.STEP": height 8.38, standoff -2.92, extent -45.009,6.731 -19.609,9.271
3D body "483380065.STEP": height 19, standoff 11.85, extent -67.85,56.2 -37.85,65.5
3D body "User Library-PCI Express Mini Card (Full-Mini Card).step": height 20.7, standoff 15.95, extent -68,9.525 -38,60.475
3D body "screwcl_m3x16.stp": height 14.56, standoff -3.44, extent -116.542,60.75 -111.042,66.25
3D body "screwcl_m3x16.stp": height 14.56, standoff -3.44, extent -116.542,-2.75 -111.042,2.75
3D body "screwcl_m3x16.stp": height 14.56, standoff -3.44, extent -2.75,60.75 2.75,66.25
3D body "screwcl_m3x16.stp": height 14.56, standoff -3.44, extent -2.75,-2.75 2.75,2.75
3D body "User Library-MicroUSB-B_Molex_105017-0001.step": height 11.83, standoff 8.52, extent -79.6,-5.5 -71.4,-0.07
3D body: height 18, standoff 12.6, extent -84.4,59.3 -71.5,64.5
3D body "User Library-RMS-001L-08A0-GY.STEP": height 14.85, standoff -1.95, extent -108.075,-6.604 -92.075,14.696

## NUCLEO-32 [mm]
pads (30):
  rect 2x1.7 hole 1: 1(1.651,41.427) 16(16.891,41.427)
  oval 2x1.7 hole 1: 2(1.651,38.887) 3(1.651,36.347) 4(1.651,33.807) 5(1.651,31.267) 6(1.651,28.727) 7(1.651,26.187) 8(1.651,23.647) 9(1.651,21.107) 10(1.651,18.567) 11(1.651,16.027) 12(1.651,13.487) 13(1.651,10.947) 14(1.651,8.407) 15(1.651,5.867) 17(16.891,38.887) 18(16.891,36.347) 19(16.891,33.807) 20(16.891,31.267) 21(16.891,28.727) 22(16.891,26.187) 23(16.891,23.647) 24(16.891,21.107) 25(16.891,18.567) 26(16.891,16.027) 27(16.891,13.487) 28(16.891,10.947) 29(16.891,8.407) 30(16.891,5.867)
Top Layer:
  lines w0.127: 16.713,13.31 16.891,13.487 ; 16.891,15.824 16.891,16.027
Bottom Layer:
  lines w0.127: 1.651,5.867 1.651,6.179 ; 1.651,13.487 1.829,13.487 ; 16.84,26.137 16.891,26.187
Top Overlay:
  lines w0.2: 0,0 18.542,0 18.542,50.292 0,50.292 0,0
  lines w0.254: 0.451,40.157 2.794,40.157 ; 15.691,40.157 18.034,40.157 ; 0.451,4.327 0.451,42.951 2.851,42.951 2.851,4.327 0.451,4.327 ; 15.691,4.327 15.691,42.951 18.091,42.951 18.091,4.327 15.691,4.327
  text "D1/TX" at 3.54,43.002 h1.02
  text "D0/RX" at 3.565,40.081 h1.02
  text "RST" at 3.515,37.16 h1.02
  text "D2" at 3.515,31.725 h1.02
  text "D3" at 3.515,29.337 h1.02
  text "D4" at 3.515,26.772 h1.02
  text "D5" at 3.515,24.206 h1.02
  text "D6" at 3.515,21.641 h1.02
  text "D7" at 3.515,19.101 h1.02
  text "D8" at 3.515,16.586 h1.02
  text "D9" at 3.515,14.072 h1.02
  text "D10" at 3.515,11.735 h1.02
  text "D11" at 3.515,9.144 h1.02
  text "D12" at 3.515,6.369 h1.02
  text "VIN" at 14.367,42.215 h1.02
  text "D13" at 14.367,6.375 h1.02
  text "3V3" at 14.367,9.169 h1.02
  text "REF" at 14.367,11.786 h1.02
  text "A0" at 14.367,13.97 h1.02
  text "A1" at 14.367,16.586 h1.02
  text "A2" at 14.367,19.126 h1.02
  text "A3" at 14.367,21.666 h1.02
  text "A4" at 14.367,24.232 h1.02
  text "A5" at 14.367,26.721 h1.02
  text "A6" at 14.367,29.312 h1.02
  text "A7" at 14.367,31.801 h1.02
  text "5V" at 14.367,34.112 h1.02
  text "RST" at 14.367,37.109 h1.02
  text "GND" at 14.367,39.853 h1.02
  text "GND" at 3.515,34.747 h1.02
3D body "Samtec-SSW-115-01-G-S.step": height 8.51, standoff -2.64, extent 0.444,4.343 2.858,42.951
3D body "Samtec-SSW-115-01-G-S.step": height 8.51, standoff -2.64, extent 15.684,4.343 18.098,42.951
3D body "MB1180.step": height 15.57, standoff -0.82, extent 0,-0.673 18.542,51.334

## NUCLEO-F103RB [mil]
pads (111):
  round 125.98 hole 125.98 unplated: 0(0,1950) 0(1300,-100) 0(1900,1900)
  rect 70x55 hole 40: CN7_1(-300,1800) CN7_10(0,1400) CN7_28(0,500) CN10_1(2100,1800) CN10_21(1900,860) CN10_37(1900,0)
  oval 70x55 hole 40: CN7_2(-200,1800) CN7_3(-300,1700) CN7_4(-200,1700) CN7_5(-300,1600) CN7_6(-200,1600) CN7_7(-300,1500) CN7_8(-200,1500) CN7_9(-300,1400) CN7_10(-200,1400) CN7_11(-300,1300) CN7_12(-200,1300) CN7_12(0,1300) CN7_13(-300,1200) CN7_14(-200,1200) CN7_14(0,1200) CN7_15(-300,1100) CN7_16(-200,1100) CN7_16(0,1100) CN7_17(-300,1000) CN7_18(-200,1000) CN7_18(0,1000) CN7_19(-300,900) CN7_20(-200,900) CN7_20(0,900) CN7_21(-300,800) CN7_22(-200,800) CN7_22(0,800) CN7_23(-300,700) CN7_24(-200,700) CN7_24(0,700) CN7_25(-300,600) CN7_26(-200,600) CN7_27(-300,500) CN7_28(-200,500) CN7_29(-300,400) CN7_30(-200,400) CN7_30(0,400) CN7_31(-300,300) CN7_32(-200,300) CN7_32(0,300) CN7_33(-300,200) CN7_34(-200,200) CN7_34(0,200) CN7_35(-300,100) CN7_36(-200,100) CN7_36(0,100) CN7_37(-300,0) CN7_38(-200,0) CN7_38(0,0) CN10_2(2200,1800) CN10_3(1900,1760) CN10_3(2100,1700) CN10_4(2200,1700) CN10_5(1900,1660) CN10_5(2100,1600) CN10_6(2200,1600) CN10_7(1900,1560) CN10_7(2100,1500) CN10_8(2200,1500) CN10_9(1900,1460) CN10_9(2100,1400) CN10_10(2200,1400) CN10_11(1900,1360) CN10_11(2100,1300) CN10_12(2200,1300) CN10_13(1900,1260) CN10_13(2100,1200) CN10_14(2200,1200) CN10_15(1900,1160) CN10_15(2100,1100) CN10_16(2200,1100) CN10_17(1900,1060) CN10_17(2100,1000) CN10_18(2200,1000) CN10_19(1900,960) CN10_19(2100,900) CN10_20(2200,900) CN10_21(2100,800) CN10_22(2200,800) CN10_23(1900,700) CN10_23(2100,700) CN10_24(2200,700) CN10_25(1900,600) CN10_25(2100,600) CN10_26(2200,600) CN10_27(1900,500) CN10_27(2100,500) CN10_28(2200,500) CN10_29(1900,400) CN10_29(2100,400) CN10_30(2200,400) CN10_31(1900,300) CN10_31(2100,300) CN10_32(2200,300) CN10_33(1900,200) CN10_33(2100,200) CN10_34(2200,200) CN10_35(1900,100) CN10_35(2100,100) CN10_36(2200,100) CN10_37(2100,0) CN10_38(2200,0)
Top Overlay:
  circle w15: c-75,499.92 r7.5
  circle w15: c1975,0.08 r7.5
  circle w15: c2025,1799.92 r7.5
  circle w15: c-375,1799.92 r7.5
  circle w15: c-75,1399.92 r7.5
  circle w15: c1975,860.08 r7.5
  lines w3: 60,-50 160,-50 160,116 160,320 ; 60,550 160,550 160,420 ; 60,650 210,650 210,810 ; 60,1140 210,1140 210,1010
  lines w7.87: -350,-50 -150,-50 -150,1850 -350,1850 -350,-50 ; -50,-50 50,-50 50,550 -50,550 -50,-50 ; -50,650 -50,1450 50,1450 50,650 -50,650 ; 1850,-50 1850,750 1950,750 1950,-50 1850,-50 ; 1850,810 1850,1810 1950,1810 1950,810 1850,810 ; 2050,-50 2050,1850 2250,1850 2250,-50 2050,-50
  text "PWM/D5" at 1620,470 h40
  text "D4" at 1770,370 h40
  text "PWM/D3" at 1620,270 h40
  text "D2" at 1770,170 h40
  text "TX/D1" at 1670,70 h40
  text "RX/D0" at 1670,-30 h40
  text "PWM/D6" at 1620,570 h40
  text "D7" at 1770,670 h40
  text "D8" at 1770,830 h40
  text "PWM/D9" at 1620,930 h40
  text "PWM/CS/D10" at 1480,1030 h40
  text "PWM/MOSI/D11" at 1440,1130 h40
  text "MISO/D12" at 1590,1230 h40
  text "SCK/D13" at 1600,1330 h40
  text "GND" at 1730,1430 h40
  text "AVDD" at 1690,1530 h40
  text "SDA/D14" at 1610,1630 h40
  text "SCL/D15" at 1610,1740 h40
  text "GND" at 60,770 h40
  text "A5" at 60,-30 h40
  text "A4" at 60,70 h40
  text "A3" at 60,170 h40
  text "A2" at 60,270 h40
  text "A1" at 60,370 h40
  text "A0" at 60,470 h40
  text "AIN" at 180,330 h40
  text "VIN" at 60,670 h40
  text "5V" at 60,970 h40
  text "3V3" at 60,1080 h40
  text "NRST" at 60,1170 h40
  text "GND" at 60,870 h40
  text "IOREF" at 60,1280 h40
  text "POWER" at 230,820 h40
  text "GND" at -140,1480 h40
  text "E5V" at -140,1580 h40
Bottom Overlay:
  text "SCL" at 180,-20 h40
  text "SDA" at 180,80 h40
Keep-Out Layer:
  lines w5: 1481.5,-119.69 1402.76,-198.43 103.54,-198.43 24.8,-119.69 -349.21,-119.69 cw(c-349.21,-40.94) -427.95,-40.94 -427.95,2045.67 -427.95,2970.87 cw(c-349.21,2970.87) -349.21,3049.61 2249.21,3049.61 cw(c2249.21,2970.87) 2327.95,2970.87 ; 1481.5,-119.69 1481.5,-119.68 ; 1481.5,-119.68 2249.21,-119.68 ccw(c2249.21,-40.94) 2327.95,-40.94 2327.95,2045.67 2327.95,2970.87 ; 2327.95,2970.87 2327.95,2970.87
Mechanical 3:
  rectangle: 1200,2650 1650,3100
  rectangle: 2150,2750 2250,2950
  rectangle: 825,2900 1025,3000
  rectangle: 400,2600 500,3000
  rectangle: 500,2175 650,2600
  rectangle: 0,2125 100,2325
  rectangle: -350,2150 -250,2350
  rectangle: -150,2150 -50,2750
  rectangle: -350,2750 -250,2950
  rectangle: 500,1775 750,2025
  rectangle: 1150,1775 1400,2025
  rectangle: 825,1375 1025,1475
  rectangle: 1225,1625 1525,1725
  lines w5: 1480.31,-119.69 2249.21,-119.69 ccw(c2249.21,-40.95) 2327.95,-40.95 2327.95,2045.67 1698.03,2045.67 cw(c1698.03,2065.35) 1698.03,2085.04 2327.95,2085.04 2327.95,2970.87 ccw(c2249.21,2970.87) 2249.21,3049.61 -349.21,3049.61 ccw(c-349.21,2970.87) -427.95,2970.87 -427.95,2085.04 182.28,2085.04 cw(c182.28,2065.35) 182.28,2045.67 -427.95,2045.67 -427.95,-40.95 ccw(c-349.21,-40.95) -349.21,-119.69 19.68,-119.69 24.8,-119.69 103.54,-198.43 1402.76,-198.43 ; 1481.5,-119.68 1402.76,-198.43 ; 1402.76,-198.43 1402.76,-198.43 ; 320.08,2045.67 cw(c320.08,2065.35) 320.08,2085.04 1068.11,2085.04 cw(c1068.11,2065.35) 1068.11,2045.67 320.08,2045.67 ; 1250,2045.67 cw(c1250,2065.35) 1250,2085.04 1538.58,2085.04 cw(c1538.58,2065.35) 1538.58,2045.67 1250,2045.67

## Raspberry_PI_2 [mm]
pads (44):
  rect 1.6x1.6 hole 1: 1(-12.73,4.87)
  oct 1.6x1.6 hole 1: 2(-15.27,4.87) 3(-12.73,7.41) 4(-15.27,7.41) 5(-12.73,9.95) 6(-15.27,9.95) 7(-12.73,12.49) 8(-15.27,12.49) 9(-12.73,15.03) 10(-15.27,15.03) 11(-12.73,17.57) 12(-15.27,17.57) 13(-12.73,20.11) 14(-15.27,20.11) 15(-12.73,22.65) 16(-15.27,22.65) 17(-12.73,25.19) 18(-15.27,25.19) 19(-12.73,27.73) 20(-15.27,27.73) 21(-12.73,30.143) 22(-15.27,30.143) 23(-12.73,32.683) 24(-15.27,32.683) 25(-12.73,35.223) 26(-15.27,35.223) 27(-12.73,37.763) 28(-15.27,37.763) 29(-12.73,40.303) 30(-15.27,40.303) 31(-12.73,42.97) 32(-15.27,42.97) 33(-12.73,45.51) 34(-15.27,45.51) 35(-12.73,48.05) 36(-15.27,48.05) 37(-12.73,50.59) 38(-15.27,50.59) 39(-12.73,53.13) 40(-15.27,53.13)
  round 5 hole 2.6: M1(49,0) M2(49,58) M3(0,58) M4(0,0)
Top Overlay:
  lines w0.2: -3.5,-3.6 52.5,-3.6 52.5,81.5 -3.5,81.5 -3.5,-3.6
  lines w0.254: -9.5,-0.21 -18.826,-0.21 -18.826,58.21 -9.5,58.21 ; -9.5,26.587 -10.698,26.587 -10.698,0.806 -17.302,0.806 -17.302,57.194 -10.698,57.194 -10.698,31.413 -9.5,31.413 ; -9.428,-0.21 -9.428,58.21
3D body "User Library-RaspberryPi2 STEP214.STEP": height 25.6, standoff 6.85, extent -3.5,-5.5 54.8,84.12
3D body "Samtec-HTST-120-01-G-D.STEP": height 9.27, standoff -2.92, extent -18.826,-0.21 -9.352,58.21

## Raspberry_PI_2_with_Cirrus_Logic_Audio_Card [mm]
pads (64):
  rect 1.6x1.6 hole 1: 1(-12.73,4.87) A1(32.86,-25)
  oct 1.6x1.6 hole 1: 2(-15.27,4.87) 3(-12.73,7.41) 4(-15.27,7.41) 5(-12.73,9.95) 6(-15.27,9.95) 7(-12.73,12.49) 8(-15.27,12.49) 9(-12.73,15.03) 10(-15.27,15.03) 11(-12.73,17.57) 12(-15.27,17.57) 13(-12.73,20.11) 14(-15.27,20.11) 15(-12.73,22.65) 16(-15.27,22.65) 17(-12.73,25.19) 18(-15.27,25.19) 19(-12.73,27.73) 20(-15.27,27.73) 21(-12.73,30.143) 22(-15.27,30.143) 23(-12.73,32.683) 24(-15.27,32.683) 25(-12.73,35.223) 26(-15.27,35.223) 27(-12.73,37.763) 28(-15.27,37.763) 29(-12.73,40.303) 30(-15.27,40.303) 31(-12.73,42.97) 32(-15.27,42.97) 33(-12.73,45.51) 34(-15.27,45.51) 35(-12.73,48.05) 36(-15.27,48.05) 37(-12.73,50.59) 38(-15.27,50.59) 39(-12.73,53.13) 40(-15.27,53.13) A2(32.86,-27.54) A3(30.32,-25) A4(30.32,-27.54) A5(27.78,-25) A6(27.78,-27.54) A7(25.24,-25) A8(25.24,-27.54) A9(22.7,-25) A10(22.7,-27.54) A11(20.16,-25) A12(20.16,-27.54) A13(17.62,-25) A14(17.62,-27.54) A15(15.08,-25) A16(15.08,-27.54) A17(12.54,-25) A18(12.54,-27.54) A19(10,-25) A20(10,-27.54)
  round 5 hole 2.6: M1(49,0) M2(49,58) M3(0,58) M4(0,0)
Top Overlay:
  lines w0.2: -3,-13 53,-13 ; -3.5,-3.6 52.5,-3.6 52.5,81.5 -3.5,81.5 -3.5,-3.6
  lines w0.254: -9.5,-0.21 -18.826,-0.21 -18.826,58.21 -9.5,58.21 ; -9.5,26.587 -10.698,26.587 -10.698,0.806 -17.302,0.806 -17.302,57.194 -10.698,57.194 -10.698,31.413 -9.5,31.413 ; -9.428,-0.21 -9.428,58.21 ; 4.92,-21.77 4.92,-31.096 37.94,-31.096 37.94,-21.77 ; 4.92,-21.698 37.94,-21.698 ; 19.017,-21.77 19.017,-22.968 5.936,-22.968 5.936,-29.572 36.924,-29.572 36.924,-22.968 23.843,-22.968 23.843,-21.77
3D body "User Library-RaspberryPi2 STEP214.STEP": height 25.6, standoff 6.85, extent -3.5,-5.5 54.8,84.12
3D body "Samtec-HTST-120-01-G-D.STEP": height 9.27, standoff -2.92, extent -18.826,-0.21 -9.352,58.21
3D body "Samtec-HTST-110-01-G-D.STEP": height 9.27, standoff -2.92, extent 4.92,-31.172 37.94,-21.698

## STM32F4DISCOVERY [mm]
pads (104):
  round 2 hole 1: JP2_1(-26.67,60.96) JP2_2(-26.67,58.42) JP3_1(26.67,60.96) JP3_2(26.67,58.42) P1_1(-26.67,30.48) P1_2(-24.13,30.48) P1_3(-26.67,27.94) P1_4(-24.13,27.94) P1_5(-26.67,25.4) P1_6(-24.13,25.4) P1_7(-26.67,22.86) P1_8(-24.13,22.86) P1_9(-26.67,20.32) P1_10(-24.13,20.32) P1_11(-26.67,17.78) P1_12(-24.13,17.78) P1_13(-26.67,15.24) P1_14(-24.13,15.24) P1_15(-26.67,12.7) P1_16(-24.13,12.7) P1_17(-26.67,10.16) P1_18(-24.13,10.16) P1_19(-26.67,7.62) P1_20(-24.13,7.62) P1_21(-26.67,5.08) P1_22(-24.13,5.08) P1_23(-26.67,2.54) P1_24(-24.13,2.54) P1_25(-26.67,0) P1_26(-24.13,0) P1_27(-26.67,-2.54) P1_28(-24.13,-2.54) P1_29(-26.67,-5.08) P1_30(-24.13,-5.08) P1_31(-26.67,-7.62) P1_32(-24.13,-7.62) P1_33(-26.67,-10.16) P1_34(-24.13,-10.16) P1_35(-26.67,-12.7) P1_36(-24.13,-12.7) P1_37(-26.67,-15.24) P1_38(-24.13,-15.24) P1_39(-26.67,-17.78) P1_40(-24.13,-17.78) P1_41(-26.67,-20.32) P1_42(-24.13,-20.32) P1_43(-26.67,-22.86) P1_44(-24.13,-22.86) P1_45(-26.67,-25.4) P1_46(-24.13,-25.4) P1_47(-26.67,-27.94) P1_48(-24.13,-27.94) P1_49(-26.67,-30.48) P1_50(-24.13,-30.48) P2_1(24.13,30.48) P2_2(26.67,30.48) P2_3(24.13,27.94) P2_4(26.67,27.94) P2_5(24.13,25.4) P2_6(26.67,25.4) P2_7(24.13,22.86) P2_8(26.67,22.86) P2_9(24.13,20.32) P2_10(26.67,20.32) P2_11(24.13,17.78) P2_12(26.67,17.78) P2_13(24.13,15.24) P2_14(26.67,15.24) P2_15(24.13,12.7) P2_16(26.67,12.7) P2_17(24.13,10.16) P2_18(26.67,10.16) P2_19(24.13,7.62) P2_20(26.67,7.62) P2_21(24.13,5.08) P2_22(26.67,5.08) P2_23(24.13,2.54) P2_24(26.67,2.54) P2_25(24.13,0) P2_26(26.67,0) P2_27(24.13,-2.54) P2_28(26.67,-2.54) P2_29(24.13,-5.08) P2_30(26.67,-5.08) P2_31(24.13,-7.62) P2_32(26.67,-7.62) P2_33(24.13,-10.16) P2_34(26.67,-10.16) P2_35(24.13,-12.7) P2_36(26.67,-12.7) P2_37(24.13,-15.24) P2_38(26.67,-15.24) P2_39(24.13,-17.78) P2_40(26.67,-17.78) P2_41(24.13,-20.32) P2_42(26.67,-20.32) P2_43(24.13,-22.86) P2_44(26.67,-22.86) P2_45(24.13,-25.4) P2_46(26.67,-25.4) P2_47(24.13,-27.94) P2_48(26.67,-27.94) P2_49(24.13,-30.48) P2_50(26.67,-30.48)
Top Overlay:
  lines w0.25: -33,-32.7 33,-32.7 33,64.3 -33,64.3 -33,-32.7

## STM32F4DISCOVERY_NO_GND [mm]
pads (100):
  oval 2x1.7 hole 1: P1_1(-26.67,30.48) P1_2(-24.13,30.48) P1_3(-26.67,27.94) P1_4(-24.13,27.94) P1_5(-26.67,25.4) P1_6(-24.13,25.4) P1_7(-26.67,22.86) P1_8(-24.13,22.86) P1_9(-26.67,20.32) P1_10(-24.13,20.32) P1_11(-26.67,17.78) P1_12(-24.13,17.78) P1_13(-26.67,15.24) P1_14(-24.13,15.24) P1_15(-26.67,12.7) P1_16(-24.13,12.7) P1_17(-26.67,10.16) P1_18(-24.13,10.16) P1_19(-26.67,7.62) P1_20(-24.13,7.62) P1_21(-26.67,5.08) P1_22(-24.13,5.08) P1_23(-26.67,2.54) P1_24(-24.13,2.54) P1_25(-26.67,0) P1_26(-24.13,0) P1_27(-26.67,-2.54) P1_28(-24.13,-2.54) P1_29(-26.67,-5.08) P1_30(-24.13,-5.08) P1_31(-26.67,-7.62) P1_32(-24.13,-7.62) P1_33(-26.67,-10.16) P1_34(-24.13,-10.16) P1_35(-26.67,-12.7) P1_36(-24.13,-12.7) P1_37(-26.67,-15.24) P1_38(-24.13,-15.24) P1_39(-26.67,-17.78) P1_40(-24.13,-17.78) P1_41(-26.67,-20.32) P1_42(-24.13,-20.32) P1_43(-26.67,-22.86) P1_44(-24.13,-22.86) P1_45(-26.67,-25.4) P1_46(-24.13,-25.4) P1_47(-26.67,-27.94) P1_48(-24.13,-27.94) P1_49(-26.67,-30.48) P1_50(-24.13,-30.48) P2_1(24.13,30.48) P2_2(26.67,30.48) P2_3(24.13,27.94) P2_4(26.67,27.94) P2_5(24.13,25.4) P2_6(26.67,25.4) P2_7(24.13,22.86) P2_8(26.67,22.86) P2_9(24.13,20.32) P2_10(26.67,20.32) P2_11(24.13,17.78) P2_12(26.67,17.78) P2_13(24.13,15.24) P2_14(26.67,15.24) P2_15(24.13,12.7) P2_16(26.67,12.7) P2_17(24.13,10.16) P2_18(26.67,10.16) P2_19(24.13,7.62) P2_20(26.67,7.62) P2_21(24.13,5.08) P2_22(26.67,5.08) P2_23(24.13,2.54) P2_24(26.67,2.54) P2_25(24.13,0) P2_26(26.67,0) P2_27(24.13,-2.54) P2_28(26.67,-2.54) P2_29(24.13,-5.08) P2_30(26.67,-5.08) P2_31(24.13,-7.62) P2_32(26.67,-7.62) P2_33(24.13,-10.16) P2_34(26.67,-10.16) P2_35(24.13,-12.7) P2_36(26.67,-12.7) P2_37(24.13,-15.24) P2_38(26.67,-15.24) P2_39(24.13,-17.78) P2_40(26.67,-17.78) P2_41(24.13,-20.32) P2_42(26.67,-20.32) P2_43(24.13,-22.86) P2_44(26.67,-22.86) P2_45(24.13,-25.4) P2_46(26.67,-25.4) P2_47(24.13,-27.94) P2_48(26.67,-27.94) P2_49(24.13,-30.48) P2_50(26.67,-30.48)
Top Overlay:
  lines w0.25: -33,-32.7 33,-32.7 33,64.3 -33,64.3 -33,-32.7